# Altium footprint library 1.27插件排母.PcbLib: 33 footprints (part 2 of 3)
Each footprint in its own frame and in the unit in brackets; x right, y up, seen from the top. Pads: shape width x height; smd on the part's side, far side on the other; paste and mask are expansions set on the pad; w line width, h text height; cw(c..) or ccw(c..) is an arc to the next point about the centre after c.
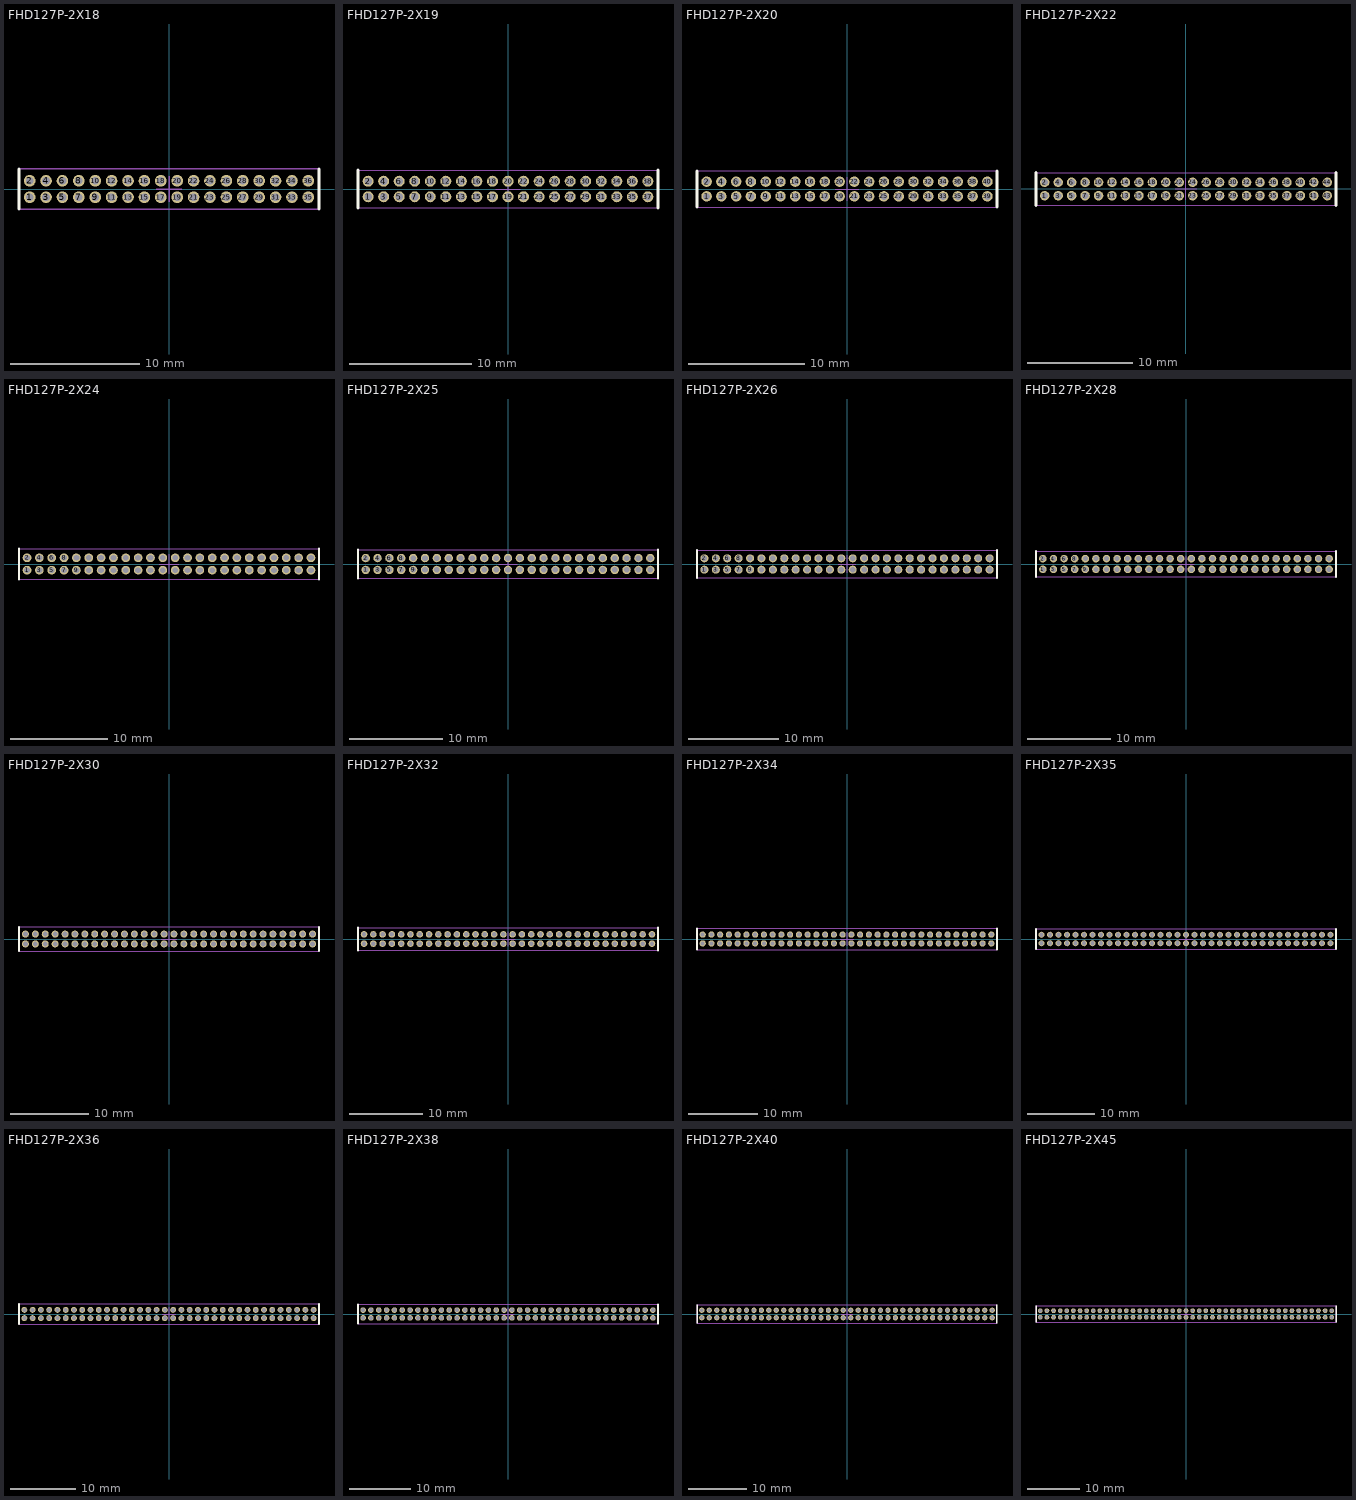
[diagram p1: the footprints below, top view; thin cyan lines are the x and y axes]

## FHD127P-2X18 [mm] "1.27mm脚距 插件 双排母"
height 3.4
pads (36):
  round 0.9 hole 0.6: 1(-10.795,-0.635) 2(-10.795,0.635) 3(-9.525,-0.635) 4(-9.525,0.635) 5(-8.255,-0.635) 6(-8.255,0.635) 7(-6.985,-0.635) 8(-6.985,0.635) 9(-5.715,-0.635) 10(-5.715,0.635) 11(-4.445,-0.635) 12(-4.445,0.635) 13(-3.175,-0.635) 14(-3.175,0.635) 15(-1.905,-0.635) 16(-1.905,0.635) 17(-0.635,-0.635) 18(-0.635,0.635) 19(0.635,-0.635) 20(0.635,0.635) 21(1.905,-0.635) 22(1.905,0.635) 23(3.175,-0.635) 24(3.175,0.635) 25(4.445,-0.635) 26(4.445,0.635) 27(5.715,-0.635) 28(5.715,0.635) 29(6.985,-0.635) 30(6.985,0.635) 31(8.255,-0.635) 32(8.255,0.635) 33(9.525,-0.635) 34(9.525,0.635) 35(10.795,-0.635) 36(10.795,0.635)
Top Overlay:
  lines w0.254: -11.62,-1.55 -11.62,1.55 ; 11.62,-1.55 11.62,1.55
Mechanical 13:
  lines w0.1: -11.62,-1.55 11.62,-1.55 11.62,1.55 -11.62,1.55 -11.62,-1.55
Mechanical 15:
  lines w0.1: -1,0 1,0 ; 0,-1 0,1
3D body: height 3.4, standoff -2.4, extent -11.62,-1.499 11.62,1.501

## FHD127P-2X19 [mm] "1.27mm脚距 插件 双排母"
height 3.4
pads (38):
  round 0.9 hole 0.6: 1(-11.43,-0.635) 2(-11.43,0.635) 3(-10.16,-0.635) 4(-10.16,0.635) 5(-8.89,-0.635) 6(-8.89,0.635) 7(-7.62,-0.635) 8(-7.62,0.635) 9(-6.35,-0.635) 10(-6.35,0.635) 11(-5.08,-0.635) 12(-5.08,0.635) 13(-3.81,-0.635) 14(-3.81,0.635) 15(-2.54,-0.635) 16(-2.54,0.635) 17(-1.27,-0.635) 18(-1.27,0.635) 19(0,-0.635) 20(0,0.635) 21(1.27,-0.635) 22(1.27,0.635) 23(2.54,-0.635) 24(2.54,0.635) 25(3.81,-0.635) 26(3.81,0.635) 27(5.08,-0.635) 28(5.08,0.635) 29(6.35,-0.635) 30(6.35,0.635) 31(7.62,-0.635) 32(7.62,0.635) 33(8.89,-0.635) 34(8.89,0.635) 35(10.16,-0.635) 36(10.16,0.635) 37(11.43,-0.635) 38(11.43,0.635)
Top Overlay:
  lines w0.254: -12.255,-1.55 -12.255,1.55 ; 12.255,-1.55 12.255,1.55
Mechanical 13:
  lines w0.1: -12.255,-1.55 12.255,-1.55 12.255,1.55 -12.255,1.55 -12.255,-1.55
Mechanical 15:
  lines w0.1: -1,0 1,0 ; 0,-1 0,1
3D body: height 3.4, standoff -2.4, extent -12.255,-1.499 12.255,1.501

## FHD127P-2X20 [mm] "1.27mm脚距 插件 双排母"
height 3.4
pads (40):
  round 0.9 hole 0.6: 1(-12.065,-0.635) 2(-12.065,0.635) 3(-10.795,-0.635) 4(-10.795,0.635) 5(-9.525,-0.635) 6(-9.525,0.635) 7(-8.255,-0.635) 8(-8.255,0.635) 9(-6.985,-0.635) 10(-6.985,0.635) 11(-5.715,-0.635) 12(-5.715,0.635) 13(-4.445,-0.635) 14(-4.445,0.635) 15(-3.175,-0.635) 16(-3.175,0.635) 17(-1.905,-0.635) 18(-1.905,0.635) 19(-0.635,-0.635) 20(-0.635,0.635) 21(0.635,-0.635) 22(0.635,0.635) 23(1.905,-0.635) 24(1.905,0.635) 25(3.175,-0.635) 26(3.175,0.635) 27(4.445,-0.635) 28(4.445,0.635) 29(5.715,-0.635) 30(5.715,0.635) 31(6.985,-0.635) 32(6.985,0.635) 33(8.255,-0.635) 34(8.255,0.635) 35(9.525,-0.635) 36(9.525,0.635) 37(10.795,-0.635) 38(10.795,0.635) 39(12.065,-0.635) 40(12.065,0.635)
Top Overlay:
  lines w0.254: -12.89,-1.55 -12.89,1.55 ; 12.89,-1.55 12.89,1.55
Mechanical 13:
  lines w0.1: -12.89,-1.55 -12.89,1.55 12.89,1.55 12.89,-1.55 -12.89,-1.55
Mechanical 15:
  lines w0.1: -1,0 1,0 ; 0,-1 0,1
3D body: height 3.4, standoff -2.4, extent -12.89,-1.499 12.89,1.501

## FHD127P-2X22 [mm] "1.27mm脚距 插件 双排母"
height 3.4
pads (44):
  round 0.9 hole 0.6: 1(-13.335,-0.635) 2(-13.335,0.635) 3(-12.065,-0.635) 4(-12.065,0.635) 5(-10.795,-0.635) 6(-10.795,0.635) 7(-9.525,-0.635) 8(-9.525,0.635) 9(-8.255,-0.635) 10(-8.255,0.635) 11(-6.985,-0.635) 12(-6.985,0.635) 13(-5.715,-0.635) 14(-5.715,0.635) 15(-4.445,-0.635) 16(-4.445,0.635) 17(-3.175,-0.635) 18(-3.175,0.635) 19(-1.905,-0.635) 20(-1.905,0.635) 21(-0.635,-0.635) 22(-0.635,0.635) 23(0.635,-0.635) 24(0.635,0.635) 25(1.905,-0.635) 26(1.905,0.635) 27(3.175,-0.635) 28(3.175,0.635) 29(4.445,-0.635) 30(4.445,0.635) 31(5.715,-0.635) 32(5.715,0.635) 33(6.985,-0.635) 34(6.985,0.635) 35(8.255,-0.635) 36(8.255,0.635) 37(9.525,-0.635) 38(9.525,0.635) 39(10.795,-0.635) 40(10.795,0.635) 41(12.065,-0.635) 42(12.065,0.635) 43(13.335,-0.635) 44(13.335,0.635)
Top Overlay:
  lines w0.254: -14.16,-1.55 -14.16,1.55 ; 14.16,-1.55 14.16,1.55
Mechanical 13:
  lines w0.1: -14.16,-1.55 14.16,-1.55 14.16,1.55 -14.16,1.55 -14.16,-1.55
Mechanical 15:
  lines w0.1: -1,0 1,0 ; 0,-1 0,1
3D body: height 3.4, standoff -2.4, extent -14.16,-1.499 14.16,1.501

## FHD127P-2X24 [mm] "1.27mm脚距 插件 双排母"
height 3.4
pads (48):
  round 0.9 hole 0.6: 1(-14.605,-0.635) 2(-14.605,0.635) 3(-13.335,-0.635) 4(-13.335,0.635) 5(-12.065,-0.635) 6(-12.065,0.635) 7(-10.795,-0.635) 8(-10.795,0.635) 9(-9.525,-0.635) 10(-9.525,0.635) 11(-8.255,-0.635) 12(-8.255,0.635) 13(-6.985,-0.635) 14(-6.985,0.635) 15(-5.715,-0.635) 16(-5.715,0.635) 17(-4.445,-0.635) 18(-4.445,0.635) 19(-3.175,-0.635) 20(-3.175,0.635) 21(-1.905,-0.635) 22(-1.905,0.635) 23(-0.635,-0.635) 24(-0.635,0.635) 25(0.635,-0.635) 26(0.635,0.635) 27(1.905,-0.635) 28(1.905,0.635) 29(3.175,-0.635) 30(3.175,0.635) 31(4.445,-0.635) 32(4.445,0.635) 33(5.715,-0.635) 34(5.715,0.635) 35(6.985,-0.635) 36(6.985,0.635) 37(8.255,-0.635) 38(8.255,0.635) 39(9.525,-0.635) 40(9.525,0.635) 41(10.795,-0.635) 42(10.795,0.635) 43(12.065,-0.635) 44(12.065,0.635) 45(13.335,-0.635) 46(13.335,0.635) 47(14.605,-0.635) 48(14.605,0.635)
Top Overlay:
  lines w0.254: -15.43,-1.55 -15.43,1.55 ; 15.43,-1.55 15.43,1.55
Mechanical 13:
  lines w0.1: -15.43,-1.55 15.43,-1.55 15.43,1.55 -15.43,1.55 -15.43,-1.55
Mechanical 15:
  lines w0.1: -1,0 1,0 ; 0,-1 0,1
3D body: height 3.4, standoff -2.4, extent -15.43,-1.499 15.43,1.501

## FHD127P-2X25 [mm] "1.27mm脚距 插件 双排母"
height 3.4
pads (50):
  round 0.9 hole 0.6: 1(-15.24,-0.635) 2(-15.24,0.635) 3(-13.97,-0.635) 4(-13.97,0.635) 5(-12.7,-0.635) 6(-12.7,0.635) 7(-11.43,-0.635) 8(-11.43,0.635) 9(-10.16,-0.635) 10(-10.16,0.635) 11(-8.89,-0.635) 12(-8.89,0.635) 13(-7.62,-0.635) 14(-7.62,0.635) 15(-6.35,-0.635) 16(-6.35,0.635) 17(-5.08,-0.635) 18(-5.08,0.635) 19(-3.81,-0.635) 20(-3.81,0.635) 21(-2.54,-0.635) 22(-2.54,0.635) 23(-1.27,-0.635) 24(-1.27,0.635) 25(0,-0.635) 26(0,0.635) 27(1.27,-0.635) 28(1.27,0.635) 29(2.54,-0.635) 30(2.54,0.635) 31(3.81,-0.635) 32(3.81,0.635) 33(5.08,-0.635) 34(5.08,0.635) 35(6.35,-0.635) 36(6.35,0.635) 37(7.62,-0.635) 38(7.62,0.635) 39(8.89,-0.635) 40(8.89,0.635) 41(10.16,-0.635) 42(10.16,0.635) 43(11.43,-0.635) 44(11.43,0.635) 45(12.7,-0.635) 46(12.7,0.635) 47(13.97,-0.635) 48(13.97,0.635) 49(15.24,-0.635) 50(15.24,0.635)
Top Overlay:
  lines w0.254: -16.065,-1.55 -16.065,1.55 ; 16.065,-1.55 16.065,1.55
Mechanical 13:
  lines w0.1: -16.065,-1.55 16.065,-1.55 16.065,1.55 -16.065,1.55 -16.065,-1.55
Mechanical 15:
  lines w0.1: -1,0 1,0 ; 0,-1 0,1
3D body: height 3.4, standoff -2.4, extent -16.065,-1.499 16.065,1.501

## FHD127P-2X26 [mm] "1.27mm脚距 插件 双排母"
height 3.4
pads (52):
  round 0.9 hole 0.6: 1(-15.875,-0.635) 2(-15.875,0.635) 3(-14.605,-0.635) 4(-14.605,0.635) 5(-13.335,-0.635) 6(-13.335,0.635) 7(-12.065,-0.635) 8(-12.065,0.635) 9(-10.795,-0.635) 10(-10.795,0.635) 11(-9.525,-0.635) 12(-9.525,0.635) 13(-8.255,-0.635) 14(-8.255,0.635) 15(-6.985,-0.635) 16(-6.985,0.635) 17(-5.715,-0.635) 18(-5.715,0.635) 19(-4.445,-0.635) 20(-4.445,0.635) 21(-3.175,-0.635) 22(-3.175,0.635) 23(-1.905,-0.635) 24(-1.905,0.635) 25(-0.635,-0.635) 26(-0.635,0.635) 27(0.635,-0.635) 28(0.635,0.635) 29(1.905,-0.635) 30(1.905,0.635) 31(3.175,-0.635) 32(3.175,0.635) 33(4.445,-0.635) 34(4.445,0.635) 35(5.715,-0.635) 36(5.715,0.635) 37(6.985,-0.635) 38(6.985,0.635) 39(8.255,-0.635) 40(8.255,0.635) 41(9.525,-0.635) 42(9.525,0.635) 43(10.795,-0.635) 44(10.795,0.635) 45(12.065,-0.635) 46(12.065,0.635) 47(13.335,-0.635) 48(13.335,0.635) 49(14.605,-0.635) 50(14.605,0.635) 51(15.875,-0.635) 52(15.875,0.635)
Top Overlay:
  lines w0.254: -16.7,-1.55 -16.7,1.55 ; 16.7,-1.55 16.7,1.55
Mechanical 13:
  lines w0.1: -16.7,-1.55 -16.7,1.55 16.7,1.55 16.7,-1.55 -16.7,-1.55
Mechanical 15:
  lines w0.1: -1,0 1,0 ; 0,-1 0,1
3D body: height 3.4, standoff -2.4, extent -16.7,-1.499 16.7,1.501

## FHD127P-2X28 [mm] "1.27mm脚距 插件 双排母"
height 3.4
pads (56):
  round 0.9 hole 0.6: 1(-17.145,-0.635) 2(-17.145,0.635) 3(-15.875,-0.635) 4(-15.875,0.635) 5(-14.605,-0.635) 6(-14.605,0.635) 7(-13.335,-0.635) 8(-13.335,0.635) 9(-12.065,-0.635) 10(-12.065,0.635) 11(-10.795,-0.635) 12(-10.795,0.635) 13(-9.525,-0.635) 14(-9.525,0.635) 15(-8.255,-0.635) 16(-8.255,0.635) 17(-6.985,-0.635) 18(-6.985,0.635) 19(-5.715,-0.635) 20(-5.715,0.635) 21(-4.445,-0.635) 22(-4.445,0.635) 23(-3.175,-0.635) 24(-3.175,0.635) 25(-1.905,-0.635) 26(-1.905,0.635) 27(-0.635,-0.635) 28(-0.635,0.635) 29(0.635,-0.635) 30(0.635,0.635) 31(1.905,-0.635) 32(1.905,0.635) 33(3.175,-0.635) 34(3.175,0.635) 35(4.445,-0.635) 36(4.445,0.635) 37(5.715,-0.635) 38(5.715,0.635) 39(6.985,-0.635) 40(6.985,0.635) 41(8.255,-0.635) 42(8.255,0.635) 43(9.525,-0.635) 44(9.525,0.635) 45(10.795,-0.635) 46(10.795,0.635) 47(12.065,-0.635) 48(12.065,0.635) 49(13.335,-0.635) 50(13.335,0.635) 51(14.605,-0.635) 52(14.605,0.635) 53(15.875,-0.635) 54(15.875,0.635) 55(17.145,-0.635) 56(17.145,0.635)
Top Overlay:
  lines w0.254: -17.97,-1.55 -17.97,1.55 ; 17.97,-1.55 17.97,1.55
Mechanical 13:
  lines w0.1: -17.97,-1.55 17.97,-1.55 17.97,1.55 -17.97,1.55 -17.97,-1.55
Mechanical 15:
  lines w0.1: -1,0 1,0 ; 0,-1 0,1
3D body: height 3.4, standoff -2.4, extent -17.97,-1.499 17.97,1.501

## FHD127P-2X30 [mm] "1.27mm脚距 插件 双排母"
height 3.4
pads (60):
  round 0.9 hole 0.6: 1(-18.415,-0.635) 2(-18.415,0.635) 3(-17.145,-0.635) 4(-17.145,0.635) 5(-15.875,-0.635) 6(-15.875,0.635) 7(-14.605,-0.635) 8(-14.605,0.635) 9(-13.335,-0.635) 10(-13.335,0.635) 11(-12.065,-0.635) 12(-12.065,0.635) 13(-10.795,-0.635) 14(-10.795,0.635) 15(-9.525,-0.635) 16(-9.525,0.635) 17(-8.255,-0.635) 18(-8.255,0.635) 19(-6.985,-0.635) 20(-6.985,0.635) 21(-5.715,-0.635) 22(-5.715,0.635) 23(-4.445,-0.635) 24(-4.445,0.635) 25(-3.175,-0.635) 26(-3.175,0.635) 27(-1.905,-0.635) 28(-1.905,0.635) 29(-0.635,-0.635) 30(-0.635,0.635) 31(0.635,-0.635) 32(0.635,0.635) 33(1.905,-0.635) 34(1.905,0.635) 35(3.175,-0.635) 36(3.175,0.635) 37(4.445,-0.635) 38(4.445,0.635) 39(5.715,-0.635) 40(5.715,0.635) 41(6.985,-0.635) 42(6.985,0.635) 43(8.255,-0.635) 44(8.255,0.635) 45(9.525,-0.635) 46(9.525,0.635) 47(10.795,-0.635) 48(10.795,0.635) 49(12.065,-0.635) 50(12.065,0.635) 51(13.335,-0.635) 52(13.335,0.635) 53(14.605,-0.635) 54(14.605,0.635) 55(15.875,-0.635) 56(15.875,0.635) 57(17.145,-0.635) 58(17.145,0.635) 59(18.415,-0.635) 60(18.415,0.635)
Top Overlay:
  lines w0.254: -19.24,-1.55 -19.24,1.55 ; 19.24,-1.55 19.24,1.55
Mechanical 13:
  lines w0.1: -19.24,-1.55 -19.24,1.55 19.24,1.55 19.24,-1.55 -19.24,-1.55
Mechanical 15:
  lines w0.1: -1,0 1,0 ; 0,-1 0,1
3D body: height 3.4, standoff -2.4, extent -19.24,-1.499 19.24,1.501

## FHD127P-2X32 [mm] "1.27mm脚距 插件 双排母"
height 3.4
pads (64):
  round 0.9 hole 0.6: 1(-19.685,-0.635) 2(-19.685,0.635) 3(-18.415,-0.635) 4(-18.415,0.635) 5(-17.145,-0.635) 6(-17.145,0.635) 7(-15.875,-0.635) 8(-15.875,0.635) 9(-14.605,-0.635) 10(-14.605,0.635) 11(-13.335,-0.635) 12(-13.335,0.635) 13(-12.065,-0.635) 14(-12.065,0.635) 15(-10.795,-0.635) 16(-10.795,0.635) 17(-9.525,-0.635) 18(-9.525,0.635) 19(-8.255,-0.635) 20(-8.255,0.635) 21(-6.985,-0.635) 22(-6.985,0.635) 23(-5.715,-0.635) 24(-5.715,0.635) 25(-4.445,-0.635) 26(-4.445,0.635) 27(-3.175,-0.635) 28(-3.175,0.635) 29(-1.905,-0.635) 30(-1.905,0.635) 31(-0.635,-0.635) 32(-0.635,0.635) 33(0.635,-0.635) 34(0.635,0.635) 35(1.905,-0.635) 36(1.905,0.635) 37(3.175,-0.635) 38(3.175,0.635) 39(4.445,-0.635) 40(4.445,0.635) 41(5.715,-0.635) 42(5.715,0.635) 43(6.985,-0.635) 44(6.985,0.635) 45(8.255,-0.635) 46(8.255,0.635) 47(9.525,-0.635) 48(9.525,0.635) 49(10.795,-0.635) 50(10.795,0.635) 51(12.065,-0.635) 52(12.065,0.635) 53(13.335,-0.635) 54(13.335,0.635) 55(14.605,-0.635) 56(14.605,0.635) 57(15.875,-0.635) 58(15.875,0.635) 59(17.145,-0.635) 60(17.145,0.635) 61(18.415,-0.635) 62(18.415,0.635) 63(19.685,-0.635) 64(19.685,0.635)
Top Overlay:
  lines w0.254: -20.51,-1.55 -20.51,1.55 ; 20.51,-1.55 20.51,1.55
Mechanical 13:
  lines w0.1: -20.51,-1.55 -20.51,1.55 20.51,1.55 20.51,-1.55 -20.51,-1.55
Mechanical 15:
  lines w0.1: -1,0 1,0 ; 0,-1 0,1
3D body: height 3.4, standoff -2.4, extent -20.51,-1.499 20.51,1.501

## FHD127P-2X34 [mm] "1.27mm脚距 插件 双排母"
height 3.4
pads (68):
  round 0.9 hole 0.6: 1(-20.955,-0.635) 2(-20.955,0.635) 3(-19.685,-0.635) 4(-19.685,0.635) 5(-18.415,-0.635) 6(-18.415,0.635) 7(-17.145,-0.635) 8(-17.145,0.635) 9(-15.875,-0.635) 10(-15.875,0.635) 11(-14.605,-0.635) 12(-14.605,0.635) 13(-13.335,-0.635) 14(-13.335,0.635) 15(-12.065,-0.635) 16(-12.065,0.635) 17(-10.795,-0.635) 18(-10.795,0.635) 19(-9.525,-0.635) 20(-9.525,0.635) 21(-8.255,-0.635) 22(-8.255,0.635) 23(-6.985,-0.635) 24(-6.985,0.635) 25(-5.715,-0.635) 26(-5.715,0.635) 27(-4.445,-0.635) 28(-4.445,0.635) 29(-3.175,-0.635) 30(-3.175,0.635) 31(-1.905,-0.635) 32(-1.905,0.635) 33(-0.635,-0.635) 34(-0.635,0.635) 35(0.635,-0.635) 36(0.635,0.635) 37(1.905,-0.635) 38(1.905,0.635) 39(3.175,-0.635) 40(3.175,0.635) 41(4.445,-0.635) 42(4.445,0.635) 43(5.715,-0.635) 44(5.715,0.635) 45(6.985,-0.635) 46(6.985,0.635) 47(8.255,-0.635) 48(8.255,0.635) 49(9.525,-0.635) 50(9.525,0.635) 51(10.795,-0.635) 52(10.795,0.635) 53(12.065,-0.635) 54(12.065,0.635) 55(13.335,-0.635) 56(13.335,0.635) 57(14.605,-0.635) 58(14.605,0.635) 59(15.875,-0.635) 60(15.875,0.635) 61(17.145,-0.635) 62(17.145,0.635) 63(18.415,-0.635) 64(18.415,0.635) 65(19.685,-0.635) 66(19.685,0.635) 67(20.955,-0.635) 68(20.955,0.635)
Top Overlay:
  lines w0.254: -21.78,-1.55 -21.78,1.55 ; 21.78,-1.55 21.78,1.55
Mechanical 13:
  lines w0.1: -21.78,-1.55 -21.78,1.55 21.78,1.55 21.78,-1.55 -21.78,-1.55
Mechanical 15:
  lines w0.1: -1,0 1,0 ; 0,-1 0,1
3D body: height 3.4, standoff -2.4, extent -21.78,-1.499 21.78,1.501

## FHD127P-2X35 [mm] "1.27mm脚距 插件 双排母"
height 3.4
pads (70):
  round 0.9 hole 0.6: 1(-21.59,-0.635) 2(-21.59,0.635) 3(-20.32,-0.635) 4(-20.32,0.635) 5(-19.05,-0.635) 6(-19.05,0.635) 7(-17.78,-0.635) 8(-17.78,0.635) 9(-16.51,-0.635) 10(-16.51,0.635) 11(-15.24,-0.635) 12(-15.24,0.635) 13(-13.97,-0.635) 14(-13.97,0.635) 15(-12.7,-0.635) 16(-12.7,0.635) 17(-11.43,-0.635) 18(-11.43,0.635) 19(-10.16,-0.635) 20(-10.16,0.635) 21(-8.89,-0.635) 22(-8.89,0.635) 23(-7.62,-0.635) 24(-7.62,0.635) 25(-6.35,-0.635) 26(-6.35,0.635) 27(-5.08,-0.635) 28(-5.08,0.635) 29(-3.81,-0.635) 30(-3.81,0.635) 31(-2.54,-0.635) 32(-2.54,0.635) 33(-1.27,-0.635) 34(-1.27,0.635) 35(0,-0.635) 36(0,0.635) 37(1.27,-0.635) 38(1.27,0.635) 39(2.54,-0.635) 40(2.54,0.635) 41(3.81,-0.635) 42(3.81,0.635) 43(5.08,-0.635) 44(5.08,0.635) 45(6.35,-0.635) 46(6.35,0.635) 47(7.62,-0.635) 48(7.62,0.635) 49(8.89,-0.635) 50(8.89,0.635) 51(10.16,-0.635) 52(10.16,0.635) 53(11.43,-0.635) 54(11.43,0.635) 55(12.7,-0.635) 56(12.7,0.635) 57(13.97,-0.635) 58(13.97,0.635) 59(15.24,-0.635) 60(15.24,0.635) 61(16.51,-0.635) 62(16.51,0.635) 63(17.78,-0.635) 64(17.78,0.635) 65(19.05,-0.635) 66(19.05,0.635) 67(20.32,-0.635) 68(20.32,0.635) 69(21.59,-0.635) 70(21.59,0.635)
Top Overlay:
  lines w0.254: -22.415,-1.55 -22.415,1.55 ; 22.415,-1.55 22.415,1.55
Mechanical 13:
  lines w0.1: -22.415,-1.55 22.415,-1.55 22.415,1.55 -22.415,1.55 -22.415,-1.55
Mechanical 15:
  lines w0.1: -1,0 1,0 ; 0,-1 0,1
3D body: height 3.4, standoff -2.4, extent -22.415,-1.5 22.415,1.5

## FHD127P-2X36 [mm] "1.27mm脚距 插件 双排母"
height 3.4
pads (72):
  round 0.9 hole 0.6: 1(-22.225,-0.635) 2(-22.225,0.635) 3(-20.955,-0.635) 4(-20.955,0.635) 5(-19.685,-0.635) 6(-19.685,0.635) 7(-18.415,-0.635) 8(-18.415,0.635) 9(-17.145,-0.635) 10(-17.145,0.635) 11(-15.875,-0.635) 12(-15.875,0.635) 13(-14.605,-0.635) 14(-14.605,0.635) 15(-13.335,-0.635) 16(-13.335,0.635) 17(-12.065,-0.635) 18(-12.065,0.635) 19(-10.795,-0.635) 20(-10.795,0.635) 21(-9.525,-0.635) 22(-9.525,0.635) 23(-8.255,-0.635) 24(-8.255,0.635) 25(-6.985,-0.635) 26(-6.985,0.635) 27(-5.715,-0.635) 28(-5.715,0.635) 29(-4.445,-0.635) 30(-4.445,0.635) 31(-3.175,-0.635) 32(-3.175,0.635) 33(-1.905,-0.635) 34(-1.905,0.635) 35(-0.635,-0.635) 36(-0.635,0.635) 37(0.635,-0.635) 38(0.635,0.635) 39(1.905,-0.635) 40(1.905,0.635) 41(3.175,-0.635) 42(3.175,0.635) 43(4.445,-0.635) 44(4.445,0.635) 45(5.715,-0.635) 46(5.715,0.635) 47(6.985,-0.635) 48(6.985,0.635) 49(8.255,-0.635) 50(8.255,0.635) 51(9.525,-0.635) 52(9.525,0.635) 53(10.795,-0.635) 54(10.795,0.635) 55(12.065,-0.635) 56(12.065,0.635) 57(13.335,-0.635) 58(13.335,0.635) 59(14.605,-0.635) 60(14.605,0.635) 61(15.875,-0.635) 62(15.875,0.635) 63(17.145,-0.635) 64(17.145,0.635) 65(18.415,-0.635) 66(18.415,0.635) 67(19.685,-0.635) 68(19.685,0.635) 69(20.955,-0.635) 70(20.955,0.635) 71(22.225,-0.635) 72(22.225,0.635)
Top Overlay:
  lines w0.254: -23.05,-1.55 -23.05,1.55 ; 23.05,-1.55 23.05,1.55
Mechanical 13:
  lines w0.1: -23.05,-1.55 23.05,-1.55 23.05,1.55 -23.05,1.55 -23.05,-1.55
Mechanical 15:
  lines w0.1: -1,0 1,0 ; 0,-1 0,1
3D body: height 3.4, standoff -2.4, extent -23.062,-1.5 23.038,1.5

## FHD127P-2X38 [mm] "1.27mm脚距 插件 双排母"
height 3.4
pads (76):
  round 0.9 hole 0.6: 1(-23.495,-0.635) 2(-23.495,0.635) 3(-22.225,-0.635) 4(-22.225,0.635) 5(-20.955,-0.635) 6(-20.955,0.635) 7(-19.685,-0.635) 8(-19.685,0.635) 9(-18.415,-0.635) 10(-18.415,0.635) 11(-17.145,-0.635) 12(-17.145,0.635) 13(-15.875,-0.635) 14(-15.875,0.635) 15(-14.605,-0.635) 16(-14.605,0.635) 17(-13.335,-0.635) 18(-13.335,0.635) 19(-12.065,-0.635) 20(-12.065,0.635) 21(-10.795,-0.635) 22(-10.795,0.635) 23(-9.525,-0.635) 24(-9.525,0.635) 25(-8.255,-0.635) 26(-8.255,0.635) 27(-6.985,-0.635) 28(-6.985,0.635) 29(-5.715,-0.635) 30(-5.715,0.635) 31(-4.445,-0.635) 32(-4.445,0.635) 33(-3.175,-0.635) 34(-3.175,0.635) 35(-1.905,-0.635) 36(-1.905,0.635) 37(-0.635,-0.635) 38(-0.635,0.635) 39(0.635,-0.635) 40(0.635,0.635) 41(1.905,-0.635) 42(1.905,0.635) 43(3.175,-0.635) 44(3.175,0.635) 45(4.445,-0.635) 46(4.445,0.635) 47(5.715,-0.635) 48(5.715,0.635) 49(6.985,-0.635) 50(6.985,0.635) 51(8.255,-0.635) 52(8.255,0.635) 53(9.525,-0.635) 54(9.525,0.635) 55(10.795,-0.635) 56(10.795,0.635) 57(12.065,-0.635) 58(12.065,0.635) 59(13.335,-0.635) 60(13.335,0.635) 61(14.605,-0.635) 62(14.605,0.635) 63(15.875,-0.635) 64(15.875,0.635) 65(17.145,-0.635) 66(17.145,0.635) 67(18.415,-0.635) 68(18.415,0.635) 69(19.685,-0.635) 70(19.685,0.635) 71(20.955,-0.635) 72(20.955,0.635) 73(22.225,-0.635) 74(22.225,0.635) 75(23.495,-0.635) 76(23.495,0.635)
Top Overlay:
  lines w0.254: -24.32,-1.55 -24.32,1.55 ; 24.32,-1.55 24.32,1.55
Mechanical 13:
  lines w0.1: -24.32,-1.55 24.32,-1.55 24.32,1.55 -24.32,1.55 -24.32,-1.55
Mechanical 15:
  lines w0.1: -1,0 1,0 ; 0,-1 0,1
3D body: height 3.4, standoff -2.4, extent -24.332,-1.5 24.308,1.5

## FHD127P-2X40 [mm] "1.27mm脚距 插件 双排母"
height 3.4
pads (80):
  round 0.9 hole 0.6: 1(-24.765,-0.635) 2(-24.765,0.635) 3(-23.495,-0.635) 4(-23.495,0.635) 5(-22.225,-0.635) 6(-22.225,0.635) 7(-20.955,-0.635) 8(-20.955,0.635) 9(-19.685,-0.635) 10(-19.685,0.635) 11(-18.415,-0.635) 12(-18.415,0.635) 13(-17.145,-0.635) 14(-17.145,0.635) 15(-15.875,-0.635) 16(-15.875,0.635) 17(-14.605,-0.635) 18(-14.605,0.635) 19(-13.335,-0.635) 20(-13.335,0.635) 21(-12.065,-0.635) 22(-12.065,0.635) 23(-10.795,-0.635) 24(-10.795,0.635) 25(-9.525,-0.635) 26(-9.525,0.635) 27(-8.255,-0.635) 28(-8.255,0.635) 29(-6.985,-0.635) 30(-6.985,0.635) 31(-5.715,-0.635) 32(-5.715,0.635) 33(-4.445,-0.635) 34(-4.445,0.635) 35(-3.175,-0.635) 36(-3.175,0.635) 37(-1.905,-0.635) 38(-1.905,0.635) 39(-0.635,-0.635) 40(-0.635,0.635) 41(0.635,-0.635) 42(0.635,0.635) 43(1.905,-0.635) 44(1.905,0.635) 45(3.175,-0.635) 46(3.175,0.635) 47(4.445,-0.635) 48(4.445,0.635) 49(5.715,-0.635) 50(5.715,0.635) 51(6.985,-0.635) 52(6.985,0.635) 53(8.255,-0.635) 54(8.255,0.635) 55(9.525,-0.635) 56(9.525,0.635) 57(10.795,-0.635) 58(10.795,0.635) 59(12.065,-0.635) 60(12.065,0.635) 61(13.335,-0.635) 62(13.335,0.635) 63(14.605,-0.635) 64(14.605,0.635) 65(15.875,-0.635) 66(15.875,0.635) 67(17.145,-0.635) 68(17.145,0.635) 69(18.415,-0.635) 70(18.415,0.635) 71(19.685,-0.635) 72(19.685,0.635) 73(20.955,-0.635) 74(20.955,0.635) 75(22.225,-0.635) 76(22.225,0.635) 77(23.495,-0.635) 78(23.495,0.635) 79(24.765,-0.635) 80(24.765,0.635)
Top Overlay:
  lines w0.254: -25.59,-1.55 -25.59,1.55 ; 25.59,-1.55 25.59,1.55
Mechanical 13:
  lines w0.1: -25.59,-1.55 -25.59,1.55 25.59,1.55 25.59,-1.55 -25.59,-1.55
Mechanical 15:
  lines w0.1: -1,0 1,0 ; 0,-1 0,1
3D body: height 3.4, standoff -2.4, extent -25.602,-1.5 25.578,1.5

## FHD127P-2X45 [mm] "1.27mm脚距 插件 双排母"
height 3.4
pads (90):
  round 0.9 hole 0.6: 1(-27.94,-0.635) 2(-27.94,0.635) 3(-26.67,-0.635) 4(-26.67,0.635) 5(-25.4,-0.635) 6(-25.4,0.635) 7(-24.13,-0.635) 8(-24.13,0.635) 9(-22.86,-0.635) 10(-22.86,0.635) 11(-21.59,-0.635) 12(-21.59,0.635) 13(-20.32,-0.635) 14(-20.32,0.635) 15(-19.05,-0.635) 16(-19.05,0.635) 17(-17.78,-0.635) 18(-17.78,0.635) 19(-16.51,-0.635) 20(-16.51,0.635) 21(-15.24,-0.635) 22(-15.24,0.635) 23(-13.97,-0.635) 24(-13.97,0.635) 25(-12.7,-0.635) 26(-12.7,0.635) 27(-11.43,-0.635) 28(-11.43,0.635) 29(-10.16,-0.635) 30(-10.16,0.635) 31(-8.89,-0.635) 32(-8.89,0.635) 33(-7.62,-0.635) 34(-7.62,0.635) 35(-6.35,-0.635) 36(-6.35,0.635) 37(-5.08,-0.635) 38(-5.08,0.635) 39(-3.81,-0.635) 40(-3.81,0.635) 41(-2.54,-0.635) 42(-2.54,0.635) 43(-1.27,-0.635) 44(-1.27,0.635) 45(0,-0.635) 46(0,0.635) 47(1.27,-0.635) 48(1.27,0.635) 49(2.54,-0.635) 50(2.54,0.635) 51(3.81,-0.635) 52(3.81,0.635) 53(5.08,-0.635) 54(5.08,0.635) 55(6.35,-0.635) 56(6.35,0.635) 57(7.62,-0.635) 58(7.62,0.635) 59(8.89,-0.635) 60(8.89,0.635) 61(10.16,-0.635) 62(10.16,0.635) 63(11.43,-0.635) 64(11.43,0.635) 65(12.7,-0.635) 66(12.7,0.635) 67(13.97,-0.635) 68(13.97,0.635) 69(15.24,-0.635) 70(15.24,0.635) 71(16.51,-0.635) 72(16.51,0.635) 73(17.78,-0.635) 74(17.78,0.635) 75(19.05,-0.635) 76(19.05,0.635) 77(20.32,-0.635) 78(20.32,0.635) 79(21.59,-0.635) 80(21.59,0.635) 81(22.86,-0.635) 82(22.86,0.635) 83(24.13,-0.635) 84(24.13,0.635) 85(25.4,-0.635) 86(25.4,0.635) 87(26.67,-0.635) 88(26.67,0.635) 89(27.94,-0.635) 90(27.94,0.635)
Top Overlay:
  lines w0.254: -28.765,-1.55 -28.765,1.55 ; 28.765,-1.55 28.765,1.55
Mechanical 13:
  lines w0.1: -28.765,-1.55 -28.765,1.55 28.765,1.55 28.765,-1.55 -28.765,-1.55
Mechanical 15:
  lines w0.1: -1,0 1,0 ; 0,-1 0,1
3D body: height 3.4, standoff -2.4, extent -28.777,-1.5 28.753,1.5